# Altium footprint library 排针-排母-1.27.PcbLib: 152 footprints (part 5 of 10)
Each footprint in its own frame and in the unit in brackets; x right, y up, seen from the top. Pads: shape width x height; smd on the part's side, far side on the other; paste and mask are expansions set on the pad; w line width, h text height; cw(c..) or ccw(c..) is an arc to the next point about the centre after c.
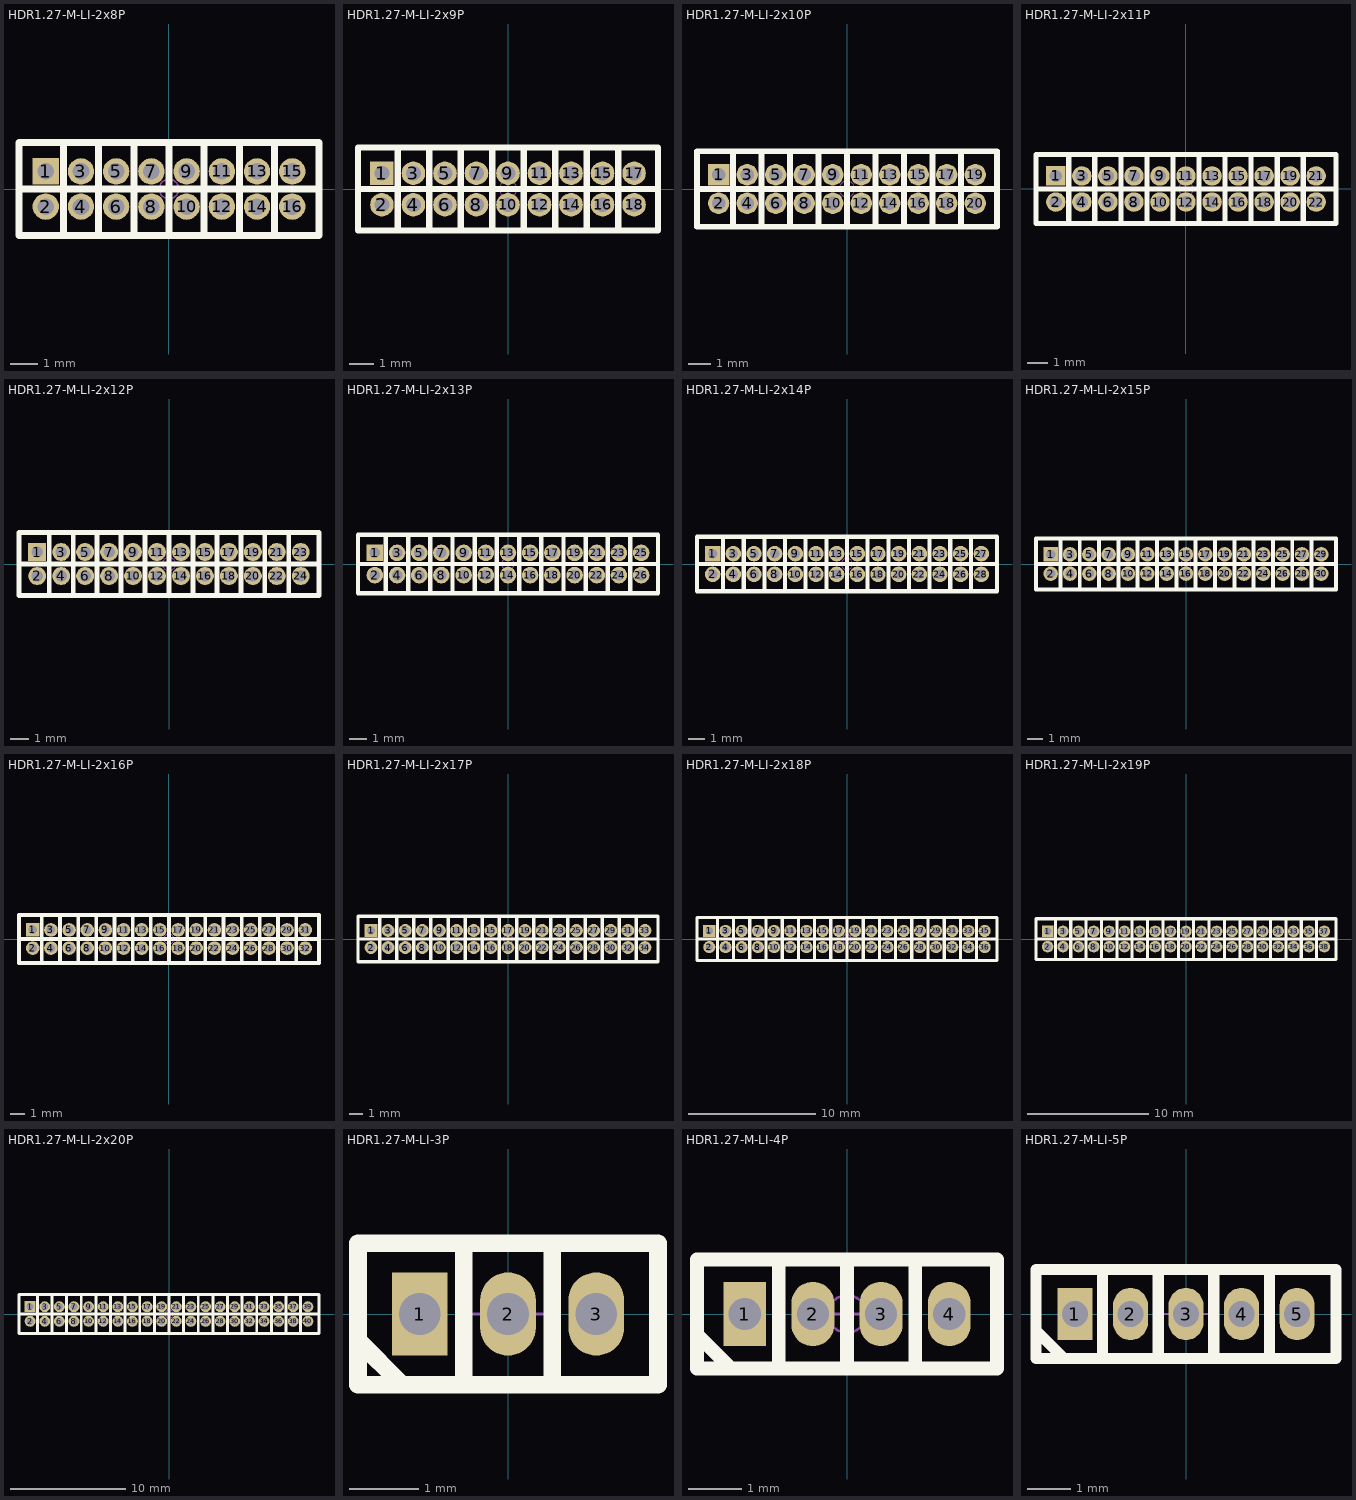
[diagram p4: the footprints below, top view; thin cyan lines are the x and y axes]

## HDR1.27-M-LI-2x8P [mm] "双排直插排母，脚距：1.27mm"
pads (16):
  rect 0.95x0.95 hole 0.6: 1(-4.445,0.635)
  round 0.95 hole 0.6: 2(-4.445,-0.635) 3(-3.175,0.635) 4(-3.175,-0.635) 5(-1.905,0.635) 6(-1.905,-0.635) 7(-0.635,0.635) 8(-0.635,-0.635) 9(0.635,0.635) 10(0.635,-0.635) 11(1.905,0.635) 12(1.905,-0.635) 13(3.175,0.635) 14(3.175,-0.635) 15(4.445,0.635) 16(4.445,-0.635)
Top Overlay:
  lines w0.254: -5.41,0 5.41,0 ; -3.81,-1.65 -3.81,1.65 ; -2.54,-1.65 -2.54,1.65 ; -1.27,-1.65 -1.27,1.65 ; 0,-1.65 0,1.65 ; 1.27,-1.65 1.27,1.65 ; 2.54,-1.65 2.54,1.65 ; 3.81,-1.65 3.81,1.65 ; -5.41,-1.676 5.41,-1.676 5.41,1.676 -5.41,1.676 -5.41,-1.676
Mechanical 15:
  circle w0.05: c0,0 r0.35
  lines w0.05: -0.5,0 0.5,0 ; 0,-0.5 0,0.5
3D body: height 4.45, standoff -2.17, extent 2.54,-1.55 3.81,1.55
3D body: height 4.45, standoff -2.17, extent 1.27,-1.55 2.54,1.55
3D body: height 4.45, standoff -2.17, extent 0,-1.55 1.27,1.55
3D body: height 4.45, standoff -2.17, extent -1.27,-1.55 0,1.55
3D body: height 4.45, standoff -2.17, extent -2.54,-1.55 -1.27,1.55
3D body: height 4.45, standoff -2.17, extent -3.81,-1.55 -2.54,1.55
3D body: height 4.45, standoff -2.17, extent -5.28,-1.55 -3.81,1.55
3D body: height 4.45, standoff -2.17, extent 3.81,-1.55 5.28,1.55

## HDR1.27-M-LI-2x9P [mm] "双排直插排母，脚距：1.27mm"
pads (18):
  rect 0.95x0.95 hole 0.6: 1(-5.08,0.635)
  round 0.95 hole 0.6: 2(-5.08,-0.635) 3(-3.81,0.635) 4(-3.81,-0.635) 5(-2.54,0.635) 6(-2.54,-0.635) 7(-1.27,0.635) 8(-1.27,-0.635) 9(0,0.635) 10(0,-0.635) 11(1.27,0.635) 12(1.27,-0.635) 13(2.54,0.635) 14(2.54,-0.635) 15(3.81,0.635) 16(3.81,-0.635) 17(5.08,0.635) 18(5.08,-0.635)
Top Overlay:
  lines w0.254: -6.045,0 6.045,0 ; -4.445,-1.65 -4.445,1.65 ; -3.175,-1.65 -3.175,1.65 ; -1.905,-1.65 -1.905,1.65 ; -0.635,-1.65 -0.635,1.65 ; 0.635,-1.65 0.635,1.65 ; 1.905,-1.65 1.905,1.65 ; 3.175,-1.65 3.175,1.65 ; 4.445,-1.65 4.445,1.65 ; -6.045,-1.676 -6.045,1.676 6.045,1.676 6.045,-1.676 -6.045,-1.676
Mechanical 15:
  circle w0.05: c0,0 r0.35
  lines w0.05: -0.5,0 0.5,0 ; 0,-0.5 0,0.5
3D body: height 4.45, standoff -2.17, extent -5.915,-1.55 -4.445,1.55
3D body: height 4.45, standoff -2.17, extent -4.445,-1.55 -3.175,1.55
3D body: height 4.45, standoff -2.17, extent -3.175,-1.55 -1.905,1.55
3D body: height 4.45, standoff -2.17, extent -1.905,-1.55 -0.635,1.55
3D body: height 4.45, standoff -2.17, extent -0.635,-1.55 0.635,1.55
3D body: height 4.45, standoff -2.17, extent 0.635,-1.55 1.905,1.55
3D body: height 4.45, standoff -2.17, extent 1.905,-1.55 3.175,1.55
3D body: height 4.45, standoff -2.17, extent 3.175,-1.55 4.445,1.55
3D body: height 4.45, standoff -2.17, extent 4.445,-1.55 5.915,1.55

## HDR1.27-M-LI-2x10P [mm] "双排直插排母，脚距：1.27mm"
pads (20):
  rect 0.95x0.95 hole 0.6: 1(-5.715,0.635)
  round 0.95 hole 0.6: 2(-5.715,-0.635) 3(-4.445,0.635) 4(-4.445,-0.635) 5(-3.175,0.635) 6(-3.175,-0.635) 7(-1.905,0.635) 8(-1.905,-0.635) 9(-0.635,0.635) 10(-0.635,-0.635) 11(0.635,0.635) 12(0.635,-0.635) 13(1.905,0.635) 14(1.905,-0.635) 15(3.175,0.635) 16(3.175,-0.635) 17(4.445,0.635) 18(4.445,-0.635) 19(5.715,0.635) 20(5.715,-0.635)
Top Overlay:
  lines w0.254: -6.68,0 6.68,0 ; -5.08,-1.65 -5.08,1.65 ; -3.81,-1.65 -3.81,1.65 ; -2.54,-1.65 -2.54,1.65 ; -1.27,-1.65 -1.27,1.65 ; 0,-1.65 0,1.65 ; 1.27,-1.65 1.27,1.65 ; 2.54,-1.65 2.54,1.65 ; 3.81,-1.65 3.81,1.65 ; 5.08,-1.65 5.08,1.65 ; -6.68,-1.676 -6.68,1.676 6.68,1.676 6.68,-1.676 -6.68,-1.676
Mechanical 15:
  circle w0.05: c0,0 r0.35
  lines w0.05: -0.5,0 0.5,0 ; 0,-0.5 0,0.5
3D body: height 4.45, standoff -2.17, extent -6.55,-1.55 -5.08,1.55
3D body: height 4.45, standoff -2.17, extent -5.08,-1.55 -3.81,1.55
3D body: height 4.45, standoff -2.17, extent -3.81,-1.55 -2.54,1.55
3D body: height 4.45, standoff -2.17, extent -2.54,-1.55 -1.27,1.55
3D body: height 4.45, standoff -2.17, extent -1.27,-1.55 0,1.55
3D body: height 4.45, standoff -2.17, extent 0,-1.55 1.27,1.55
3D body: height 4.45, standoff -2.17, extent 1.27,-1.55 2.54,1.55
3D body: height 4.45, standoff -2.17, extent 2.54,-1.55 3.81,1.55
3D body: height 4.45, standoff -2.17, extent 3.81,-1.55 5.08,1.55
3D body: height 4.45, standoff -2.17, extent 5.08,-1.55 6.55,1.55

## HDR1.27-M-LI-2x11P [mm] "双排直插排母，脚距：1.27mm"
pads (22):
  rect 0.95x0.95 hole 0.6: 1(-6.35,0.635)
  round 0.95 hole 0.6: 2(-6.35,-0.635) 3(-5.08,0.635) 4(-5.08,-0.635) 5(-3.81,0.635) 6(-3.81,-0.635) 7(-2.54,0.635) 8(-2.54,-0.635) 9(-1.27,0.635) 10(-1.27,-0.635) 11(0,0.635) 12(0,-0.635) 13(1.27,0.635) 14(1.27,-0.635) 15(2.54,0.635) 16(2.54,-0.635) 17(3.81,0.635) 18(3.81,-0.635) 19(5.08,0.635) 20(5.08,-0.635) 21(6.35,0.635) 22(6.35,-0.635)
Top Overlay:
  lines w0.254: -7.315,0 7.315,0 ; -5.715,-1.65 -5.715,1.65 ; -4.445,-1.65 -4.445,1.65 ; -3.175,-1.65 -3.175,1.65 ; -1.905,-1.65 -1.905,1.65 ; -0.635,-1.65 -0.635,1.65 ; 0.635,-1.65 0.635,1.65 ; 1.905,-1.65 1.905,1.65 ; 3.175,-1.65 3.175,1.65 ; 4.445,-1.65 4.445,1.65 ; 5.715,-1.65 5.715,1.65 ; -7.315,-1.676 7.315,-1.676 7.315,1.676 -7.315,1.676 -7.315,-1.676
Mechanical 15:
  circle w0.05: c0,0 r0.35
  lines w0.05: -0.5,0 0.5,0 ; 0,-0.5 0,0.5
3D body: height 4.45, standoff -2.17, extent 4.445,-1.55 5.715,1.55
3D body: height 4.45, standoff -2.17, extent 3.175,-1.55 4.445,1.55
3D body: height 4.45, standoff -2.17, extent 1.905,-1.55 3.175,1.55
3D body: height 4.45, standoff -2.17, extent 0.635,-1.55 1.905,1.55
3D body: height 4.45, standoff -2.17, extent -0.635,-1.55 0.635,1.55
3D body: height 4.45, standoff -2.17, extent -1.905,-1.55 -0.635,1.55
3D body: height 4.45, standoff -2.17, extent -3.175,-1.55 -1.905,1.55
3D body: height 4.45, standoff -2.17, extent -4.445,-1.55 -3.175,1.55
3D body: height 4.45, standoff -2.17, extent -5.715,-1.55 -4.445,1.55
3D body: height 4.45, standoff -2.17, extent -7.185,-1.55 -5.715,1.55
3D body: height 4.45, standoff -2.17, extent 5.715,-1.55 7.185,1.55

## HDR1.27-M-LI-2x12P [mm] "双排直插排母，脚距：1.27mm"
pads (24):
  rect 0.95x0.95 hole 0.6: 1(-6.985,0.635)
  round 0.95 hole 0.6: 2(-6.985,-0.635) 3(-5.715,0.635) 4(-5.715,-0.635) 5(-4.445,0.635) 6(-4.445,-0.635) 7(-3.175,0.635) 8(-3.175,-0.635) 9(-1.905,0.635) 10(-1.905,-0.635) 11(-0.635,0.635) 12(-0.635,-0.635) 13(0.635,0.635) 14(0.635,-0.635) 15(1.905,0.635) 16(1.905,-0.635) 17(3.175,0.635) 18(3.175,-0.635) 19(4.445,0.635) 20(4.445,-0.635) 21(5.715,0.635) 22(5.715,-0.635) 23(6.985,0.635) 24(6.985,-0.635)
Top Overlay:
  lines w0.254: -7.95,0 7.82,0 ; -6.35,-1.65 -6.35,1.65 ; -5.08,-1.65 -5.08,1.65 ; -3.81,-1.65 -3.81,1.65 ; -2.54,-1.65 -2.54,1.65 ; -1.27,-1.65 -1.27,1.65 ; 0,-1.65 0,1.65 ; 1.27,-1.65 1.27,1.65 ; 2.54,-1.65 2.54,1.65 ; 3.81,-1.65 3.81,1.65 ; 5.08,-1.65 5.08,1.65 ; 6.35,-1.65 6.35,1.65 ; -7.95,-1.676 7.95,-1.676 7.95,1.676 -7.95,1.676 -7.95,-1.676
Mechanical 15:
  circle w0.05: c0,0 r0.35
  lines w0.05: -0.5,0 0.5,0 ; 0,-0.5 0,0.5
3D body: height 4.45, standoff -2.17, extent 5.08,-1.55 6.35,1.55
3D body: height 4.45, standoff -2.17, extent 3.81,-1.55 5.08,1.55
3D body: height 4.45, standoff -2.17, extent 2.54,-1.55 3.81,1.55
3D body: height 4.45, standoff -2.17, extent 1.27,-1.55 2.54,1.55
3D body: height 4.45, standoff -2.17, extent 0,-1.55 1.27,1.55
3D body: height 4.45, standoff -2.17, extent -1.27,-1.55 0,1.55
3D body: height 4.45, standoff -2.17, extent -2.54,-1.55 -1.27,1.55
3D body: height 4.45, standoff -2.17, extent -3.81,-1.55 -2.54,1.55
3D body: height 4.45, standoff -2.17, extent -5.08,-1.55 -3.81,1.55
3D body: height 4.45, standoff -2.17, extent -6.35,-1.55 -5.08,1.55
3D body: height 4.45, standoff -2.17, extent -7.82,-1.55 -6.35,1.55
3D body: height 4.45, standoff -2.17, extent 6.35,-1.55 7.82,1.55

## HDR1.27-M-LI-2x13P [mm] "双排直插排母，脚距：1.27mm"
pads (26):
  rect 0.95x0.95 hole 0.6: 1(-7.62,0.635)
  round 0.95 hole 0.6: 2(-7.62,-0.635) 3(-6.35,0.635) 4(-6.35,-0.635) 5(-5.08,0.635) 6(-5.08,-0.635) 7(-3.81,0.635) 8(-3.81,-0.635) 9(-2.54,0.635) 10(-2.54,-0.635) 11(-1.27,0.635) 12(-1.27,-0.635) 13(0,0.635) 14(0,-0.635) 15(1.27,0.635) 16(1.27,-0.635) 17(2.54,0.635) 18(2.54,-0.635) 19(3.81,0.635) 20(3.81,-0.635) 21(5.08,0.635) 22(5.08,-0.635) 23(6.35,0.635) 24(6.35,-0.635) 25(7.62,0.635) 26(7.62,-0.635)
Top Overlay:
  lines w0.254: -8.585,0 8.585,0 ; -6.985,-1.65 -6.985,1.65 ; -5.715,-1.65 -5.715,1.65 ; -4.445,-1.65 -4.445,1.65 ; -3.175,-1.65 -3.175,1.65 ; -1.905,-1.65 -1.905,1.65 ; -0.635,-1.65 -0.635,1.65 ; 0.635,-1.65 0.635,1.65 ; 1.905,-1.65 1.905,1.65 ; 3.175,-1.65 3.175,1.65 ; 4.445,-1.65 4.445,1.65 ; 5.715,-1.65 5.715,1.65 ; 6.985,-1.65 6.985,1.65 ; -8.585,-1.676 -8.585,1.676 8.585,1.676 8.585,-1.676 -8.585,-1.676
Mechanical 15:
  circle w0.05: c0,0 r0.35
  lines w0.05: -0.5,0 0.5,0 ; 0,-0.5 0,0.5
3D body: height 4.45, standoff -2.17, extent -8.455,-1.55 -6.985,1.55
3D body: height 4.45, standoff -2.17, extent -6.985,-1.55 -5.715,1.55
3D body: height 4.45, standoff -2.17, extent -5.715,-1.55 -4.445,1.55
3D body: height 4.45, standoff -2.17, extent -4.445,-1.55 -3.175,1.55
3D body: height 4.45, standoff -2.17, extent -3.175,-1.55 -1.905,1.55
3D body: height 4.45, standoff -2.17, extent -1.905,-1.55 -0.635,1.55
3D body: height 4.45, standoff -2.17, extent -0.635,-1.55 0.635,1.55
3D body: height 4.45, standoff -2.17, extent 0.635,-1.55 1.905,1.55
3D body: height 4.45, standoff -2.17, extent 1.905,-1.55 3.175,1.55
3D body: height 4.45, standoff -2.17, extent 3.175,-1.55 4.445,1.55
3D body: height 4.45, standoff -2.17, extent 4.445,-1.55 5.715,1.55
3D body: height 4.45, standoff -2.17, extent 5.715,-1.55 6.985,1.55
3D body: height 4.45, standoff -2.17, extent 6.985,-1.55 8.455,1.55

## HDR1.27-M-LI-2x14P [mm] "双排直插排母，脚距：1.27mm"
pads (28):
  rect 0.95x0.95 hole 0.6: 1(-8.255,0.635)
  round 0.95 hole 0.6: 2(-8.255,-0.635) 3(-6.985,0.635) 4(-6.985,-0.635) 5(-5.715,0.635) 6(-5.715,-0.635) 7(-4.445,0.635) 8(-4.445,-0.635) 9(-3.175,0.635) 10(-3.175,-0.635) 11(-1.905,0.635) 12(-1.905,-0.635) 13(-0.635,0.635) 14(-0.635,-0.635) 15(0.635,0.635) 16(0.635,-0.635) 17(1.905,0.635) 18(1.905,-0.635) 19(3.175,0.635) 20(3.175,-0.635) 21(4.445,0.635) 22(4.445,-0.635) 23(5.715,0.635) 24(5.715,-0.635) 25(6.985,0.635) 26(6.985,-0.635) 27(8.255,0.635) 28(8.255,-0.635)
Top Overlay:
  lines w0.254: -9.22,0 9.22,0 ; -7.62,-1.65 -7.62,1.65 ; -6.35,-1.65 -6.35,1.65 ; -5.08,-1.65 -5.08,1.65 ; -3.81,-1.65 -3.81,1.65 ; -2.54,-1.65 -2.54,1.65 ; -1.27,-1.65 -1.27,1.65 ; 0,-1.65 0,1.65 ; 1.27,-1.65 1.27,1.65 ; 2.54,-1.65 2.54,1.65 ; 3.81,-1.65 3.81,1.65 ; 5.08,-1.65 5.08,1.65 ; 6.35,-1.65 6.35,1.65 ; 7.62,-1.65 7.62,1.65 ; -9.22,-1.676 -9.22,1.676 9.22,1.676 9.22,-1.676 -9.22,-1.676
Mechanical 15:
  circle w0.05: c0,0 r0.35
  lines w0.05: -0.5,0 0.5,0 ; 0,-0.5 0,0.5
3D body: height 4.45, standoff -2.17, extent -9.09,-1.55 -7.62,1.55
3D body: height 4.45, standoff -2.17, extent -7.62,-1.55 -6.35,1.55
3D body: height 4.45, standoff -2.17, extent -6.35,-1.55 -5.08,1.55
3D body: height 4.45, standoff -2.17, extent -5.08,-1.55 -3.81,1.55
3D body: height 4.45, standoff -2.17, extent -3.81,-1.55 -2.54,1.55
3D body: height 4.45, standoff -2.17, extent -2.54,-1.55 -1.27,1.55
3D body: height 4.45, standoff -2.17, extent -1.27,-1.55 0,1.55
3D body: height 4.45, standoff -2.17, extent 0,-1.55 1.27,1.55
3D body: height 4.45, standoff -2.17, extent 1.27,-1.55 2.54,1.55
3D body: height 4.45, standoff -2.17, extent 2.54,-1.55 3.81,1.55
3D body: height 4.45, standoff -2.17, extent 3.81,-1.55 5.08,1.55
3D body: height 4.45, standoff -2.17, extent 5.08,-1.55 6.35,1.55
3D body: height 4.45, standoff -2.17, extent 6.35,-1.55 7.62,1.55
3D body: height 4.45, standoff -2.17, extent 7.62,-1.55 9.09,1.55

## HDR1.27-M-LI-2x15P [mm] "双排直插排母，脚距：1.27mm"
pads (30):
  rect 0.95x0.95 hole 0.6: 1(-8.89,0.635)
  round 0.95 hole 0.6: 2(-8.89,-0.635) 3(-7.62,0.635) 4(-7.62,-0.635) 5(-6.35,0.635) 6(-6.35,-0.635) 7(-5.08,0.635) 8(-5.08,-0.635) 9(-3.81,0.635) 10(-3.81,-0.635) 11(-2.54,0.635) 12(-2.54,-0.635) 13(-1.27,0.635) 14(-1.27,-0.635) 15(0,0.635) 16(0,-0.635) 17(1.27,0.635) 18(1.27,-0.635) 19(2.54,0.635) 20(2.54,-0.635) 21(3.81,0.635) 22(3.81,-0.635) 23(5.08,0.635) 24(5.08,-0.635) 25(6.35,0.635) 26(6.35,-0.635) 27(7.62,0.635) 28(7.62,-0.635) 29(8.89,0.635) 30(8.89,-0.635)
Top Overlay:
  lines w0.254: -9.855,0 9.855,0 ; -8.255,-1.65 -8.255,1.65 ; -6.985,-1.65 -6.985,1.65 ; -5.715,-1.65 -5.715,1.65 ; -4.445,-1.65 -4.445,1.65 ; -3.175,-1.65 -3.175,1.65 ; -1.905,-1.65 -1.905,1.65 ; -0.635,-1.65 -0.635,1.65 ; 0.635,-1.65 0.635,1.65 ; 1.905,-1.65 1.905,1.65 ; 3.175,-1.65 3.175,1.65 ; 4.445,-1.65 4.445,1.65 ; 5.715,-1.65 5.715,1.65 ; 6.985,-1.65 6.985,1.65 ; 8.255,-1.65 8.255,1.65 ; -9.855,-1.676 9.855,-1.676 9.855,1.676 -9.855,1.676 -9.855,-1.676
Mechanical 15:
  circle w0.05: c0,0 r0.35
  lines w0.05: -0.5,0 0.5,0 ; 0,-0.5 0,0.5
3D body: height 4.45, standoff -2.17, extent 5.715,-1.55 6.985,1.55
3D body: height 4.45, standoff -2.17, extent 6.985,-1.55 8.255,1.55
3D body: height 4.45, standoff -2.17, extent 4.445,-1.55 5.715,1.55
3D body: height 4.45, standoff -2.17, extent 3.175,-1.55 4.445,1.55
3D body: height 4.45, standoff -2.17, extent 1.905,-1.55 3.175,1.55
3D body: height 4.45, standoff -2.17, extent 0.635,-1.55 1.905,1.55
3D body: height 4.45, standoff -2.17, extent -0.635,-1.55 0.635,1.55
3D body: height 4.45, standoff -2.17, extent -1.905,-1.55 -0.635,1.55
3D body: height 4.45, standoff -2.17, extent -3.175,-1.55 -1.905,1.55
3D body: height 4.45, standoff -2.17, extent -4.445,-1.55 -3.175,1.55
3D body: height 4.45, standoff -2.17, extent -5.715,-1.55 -4.445,1.55
3D body: height 4.45, standoff -2.17, extent -6.985,-1.55 -5.715,1.55
3D body: height 4.45, standoff -2.17, extent -8.255,-1.55 -6.985,1.55
3D body: height 4.45, standoff -2.17, extent -9.725,-1.55 -8.255,1.55
3D body: height 4.45, standoff -2.17, extent 8.255,-1.55 9.725,1.55

## HDR1.27-M-LI-2x16P [mm] "双排直插排母，脚距：1.27mm"
pads (32):
  rect 0.95x0.95 hole 0.6: 1(-9.525,0.635)
  round 0.95 hole 0.6: 2(-9.525,-0.635) 3(-8.255,0.635) 4(-8.255,-0.635) 5(-6.985,0.635) 6(-6.985,-0.635) 7(-5.715,0.635) 8(-5.715,-0.635) 9(-4.445,0.635) 10(-4.445,-0.635) 11(-3.175,0.635) 12(-3.175,-0.635) 13(-1.905,0.635) 14(-1.905,-0.635) 15(-0.635,0.635) 16(-0.635,-0.635) 17(0.635,0.635) 18(0.635,-0.635) 19(1.905,0.635) 20(1.905,-0.635) 21(3.175,0.635) 22(3.175,-0.635) 23(4.445,0.635) 24(4.445,-0.635) 25(5.715,0.635) 26(5.715,-0.635) 27(6.985,0.635) 28(6.985,-0.635) 29(8.255,0.635) 30(8.255,-0.635) 31(9.525,0.635) 32(9.525,-0.635)
Top Overlay:
  lines w0.254: -10.49,0 10.49,0 ; -8.89,-1.65 -8.89,1.65 ; -7.62,-1.65 -7.62,1.65 ; -6.35,-1.65 -6.35,1.65 ; -5.08,-1.65 -5.08,1.65 ; -3.81,-1.65 -3.81,1.65 ; -2.54,-1.65 -2.54,1.65 ; -1.27,-1.65 -1.27,1.65 ; 0,-1.65 0,1.65 ; 1.27,-1.65 1.27,1.65 ; 2.54,-1.65 2.54,1.65 ; 3.81,-1.65 3.81,1.65 ; 5.08,-1.65 5.08,1.65 ; 6.35,-1.65 6.35,1.65 ; 7.62,-1.65 7.62,1.65 ; 8.89,-1.65 8.89,1.65 ; -10.49,-1.676 10.49,-1.676 10.49,1.676 -10.49,1.676 -10.49,-1.676
Mechanical 15:
  circle w0.05: c0,0 r0.35
  lines w0.05: -0.5,0 0.5,0 ; 0,-0.5 0,0.5
3D body: height 4.45, standoff -2.17, extent 8.89,-1.55 10.36,1.55
3D body: height 4.45, standoff -2.17, extent 5.08,-1.55 6.35,1.55
3D body: height 4.45, standoff -2.17, extent 6.35,-1.55 7.62,1.55
3D body: height 4.45, standoff -2.17, extent 7.62,-1.55 8.89,1.55
3D body: height 4.45, standoff -2.17, extent 3.81,-1.55 5.08,1.55
3D body: height 4.45, standoff -2.17, extent 2.54,-1.55 3.81,1.55
3D body: height 4.45, standoff -2.17, extent 1.27,-1.55 2.54,1.55
3D body: height 4.45, standoff -2.17, extent 0,-1.55 1.27,1.55
3D body: height 4.45, standoff -2.17, extent -1.27,-1.55 0,1.55
3D body: height 4.45, standoff -2.17, extent -2.54,-1.55 -1.27,1.55
3D body: height 4.45, standoff -2.17, extent -3.81,-1.55 -2.54,1.55
3D body: height 4.45, standoff -2.17, extent -5.08,-1.55 -3.81,1.55
3D body: height 4.45, standoff -2.17, extent -6.35,-1.55 -5.08,1.55
3D body: height 4.45, standoff -2.17, extent -7.62,-1.55 -6.35,1.55
3D body: height 4.45, standoff -2.17, extent -8.89,-1.55 -7.62,1.55
3D body: height 4.45, standoff -2.17, extent -10.36,-1.55 -8.89,1.55

## HDR1.27-M-LI-2x17P [mm] "双排直插排母，脚距：1.27mm"
pads (34):
  rect 0.95x0.95 hole 0.6: 1(-10.16,0.635)
  round 0.95 hole 0.6: 2(-10.16,-0.635) 3(-8.89,0.635) 4(-8.89,-0.635) 5(-7.62,0.635) 6(-7.62,-0.635) 7(-6.35,0.635) 8(-6.35,-0.635) 9(-5.08,0.635) 10(-5.08,-0.635) 11(-3.81,0.635) 12(-3.81,-0.635) 13(-2.54,0.635) 14(-2.54,-0.635) 15(-1.27,0.635) 16(-1.27,-0.635) 17(0,0.635) 18(0,-0.635) 19(1.27,0.635) 20(1.27,-0.635) 21(2.54,0.635) 22(2.54,-0.635) 23(3.81,0.635) 24(3.81,-0.635) 25(5.08,0.635) 26(5.08,-0.635) 27(6.35,0.635) 28(6.35,-0.635) 29(7.62,0.635) 30(7.62,-0.635) 31(8.89,0.635) 32(8.89,-0.635) 33(10.16,0.635) 34(10.16,-0.635)
Top Overlay:
  lines w0.254: -11.125,0 11.125,0 ; -9.525,-1.65 -9.525,1.65 ; -8.255,-1.65 -8.255,1.65 ; -6.985,-1.65 -6.985,1.65 ; -5.715,-1.65 -5.715,1.65 ; -4.445,-1.65 -4.445,1.65 ; -3.175,-1.65 -3.175,1.65 ; -1.905,-1.65 -1.905,1.65 ; -0.635,-1.65 -0.635,1.65 ; 0.635,-1.65 0.635,1.65 ; 1.905,-1.65 1.905,1.65 ; 3.175,-1.65 3.175,1.65 ; 4.445,-1.65 4.445,1.65 ; 5.715,-1.65 5.715,1.65 ; 6.985,-1.65 6.985,1.65 ; 8.255,-1.65 8.255,1.65 ; 9.525,-1.65 9.525,1.65 ; -11.125,-1.676 11.125,-1.676 11.125,1.676 -11.125,1.676 -11.125,-1.676
Mechanical 15:
  circle w0.05: c0,0 r0.35
  lines w0.05: -0.5,0 0.5,0 ; 0,-0.5 0,0.5
3D body: height 4.45, standoff -2.17, extent 4.445,-1.55 5.715,1.55
3D body: height 4.45, standoff -2.17, extent 5.715,-1.55 6.985,1.55
3D body: height 4.45, standoff -2.17, extent 6.985,-1.55 8.255,1.55
3D body: height 4.45, standoff -2.17, extent 8.255,-1.55 9.525,1.55
3D body: height 4.45, standoff -2.17, extent 3.175,-1.55 4.445,1.55
3D body: height 4.45, standoff -2.17, extent 1.905,-1.55 3.175,1.55
3D body: height 4.45, standoff -2.17, extent 0.635,-1.55 1.905,1.55
3D body: height 4.45, standoff -2.17, extent -0.635,-1.55 0.635,1.55
3D body: height 4.45, standoff -2.17, extent -1.905,-1.55 -0.635,1.55
3D body: height 4.45, standoff -2.17, extent -3.175,-1.55 -1.905,1.55
3D body: height 4.45, standoff -2.17, extent -4.445,-1.55 -3.175,1.55
3D body: height 4.45, standoff -2.17, extent -5.715,-1.55 -4.445,1.55
3D body: height 4.45, standoff -2.17, extent -6.985,-1.55 -5.715,1.55
3D body: height 4.45, standoff -2.17, extent -8.255,-1.55 -6.985,1.55
3D body: height 4.45, standoff -2.17, extent -9.525,-1.55 -8.255,1.55
3D body: height 4.45, standoff -2.17, extent -10.995,-1.55 -9.525,1.55
3D body: height 4.45, standoff -2.17, extent 9.525,-1.55 10.995,1.55

## HDR1.27-M-LI-2x18P [mm] "双排直插排母，脚距：1.27mm"
pads (36):
  rect 0.95x0.95 hole 0.6: 1(-10.795,0.635)
  round 0.95 hole 0.6: 2(-10.795,-0.635) 3(-9.525,0.635) 4(-9.525,-0.635) 5(-8.255,0.635) 6(-8.255,-0.635) 7(-6.985,0.635) 8(-6.985,-0.635) 9(-5.715,0.635) 10(-5.715,-0.635) 11(-4.445,0.635) 12(-4.445,-0.635) 13(-3.175,0.635) 14(-3.175,-0.635) 15(-1.905,0.635) 16(-1.905,-0.635) 17(-0.635,0.635) 18(-0.635,-0.635) 19(0.635,0.635) 20(0.635,-0.635) 21(1.905,0.635) 22(1.905,-0.635) 23(3.175,0.635) 24(3.175,-0.635) 25(4.445,0.635) 26(4.445,-0.635) 27(5.715,0.635) 28(5.715,-0.635) 29(6.985,0.635) 30(6.985,-0.635) 31(8.255,0.635) 32(8.255,-0.635) 33(9.525,0.635) 34(9.525,-0.635) 35(10.795,0.635) 36(10.795,-0.635)
Top Overlay:
  lines w0.254: -11.76,0 11.76,0 ; -10.16,-1.65 -10.16,1.65 ; -8.89,-1.65 -8.89,1.65 ; -7.62,-1.65 -7.62,1.65 ; -6.35,-1.65 -6.35,1.65 ; -5.08,-1.65 -5.08,1.65 ; -3.81,-1.65 -3.81,1.65 ; -2.54,-1.65 -2.54,1.65 ; -1.27,-1.65 -1.27,1.65 ; 0,-1.65 0,1.65 ; 1.27,-1.65 1.27,1.65 ; 2.54,-1.65 2.54,1.65 ; 3.81,-1.65 3.81,1.65 ; 5.08,-1.65 5.08,1.65 ; 6.35,-1.65 6.35,1.65 ; 7.62,-1.65 7.62,1.65 ; 8.89,-1.65 8.89,1.65 ; 10.16,-1.65 10.16,1.65 ; -11.76,-1.676 11.76,-1.676 11.76,1.676 -11.76,1.676 -11.76,-1.676
Mechanical 15:
  circle w0.05: c0,0 r0.35
  lines w0.05: -0.5,0 0.5,0 ; 0,-0.5 0,0.5
3D body: height 4.45, standoff -2.17, extent 3.81,-1.55 5.08,1.55
3D body: height 4.45, standoff -2.17, extent 5.08,-1.55 6.35,1.55
3D body: height 4.45, standoff -2.17, extent 6.35,-1.55 7.62,1.55
3D body: height 4.45, standoff -2.17, extent 7.62,-1.55 8.89,1.55
3D body: height 4.45, standoff -2.17, extent 8.89,-1.55 10.16,1.55
3D body: height 4.45, standoff -2.17, extent 2.54,-1.55 3.81,1.55
3D body: height 4.45, standoff -2.17, extent 1.27,-1.55 2.54,1.55
3D body: height 4.45, standoff -2.17, extent 0,-1.55 1.27,1.55
3D body: height 4.45, standoff -2.17, extent -1.27,-1.55 0,1.55
3D body: height 4.45, standoff -2.17, extent -2.54,-1.55 -1.27,1.55
3D body: height 4.45, standoff -2.17, extent -3.81,-1.55 -2.54,1.55
3D body: height 4.45, standoff -2.17, extent -5.08,-1.55 -3.81,1.55
3D body: height 4.45, standoff -2.17, extent -6.35,-1.55 -5.08,1.55
3D body: height 4.45, standoff -2.17, extent -7.62,-1.55 -6.35,1.55
3D body: height 4.45, standoff -2.17, extent -8.89,-1.55 -7.62,1.55
3D body: height 4.45, standoff -2.17, extent -10.16,-1.55 -8.89,1.55
3D body: height 4.45, standoff -2.17, extent -11.63,-1.55 -10.16,1.55
3D body: height 4.45, standoff -2.17, extent 10.16,-1.55 11.63,1.55

## HDR1.27-M-LI-2x19P [mm] "双排直插排母，脚距：1.27mm"
pads (38):
  rect 0.95x0.95 hole 0.6: 1(-11.43,0.635)
  round 0.95 hole 0.6: 2(-11.43,-0.635) 3(-10.16,0.635) 4(-10.16,-0.635) 5(-8.89,0.635) 6(-8.89,-0.635) 7(-7.62,0.635) 8(-7.62,-0.635) 9(-6.35,0.635) 10(-6.35,-0.635) 11(-5.08,0.635) 12(-5.08,-0.635) 13(-3.81,0.635) 14(-3.81,-0.635) 15(-2.54,0.635) 16(-2.54,-0.635) 17(-1.27,0.635) 18(-1.27,-0.635) 19(0,0.635) 20(0,-0.635) 21(1.27,0.635) 22(1.27,-0.635) 23(2.54,0.635) 24(2.54,-0.635) 25(3.81,0.635) 26(3.81,-0.635) 27(5.08,0.635) 28(5.08,-0.635) 29(6.35,0.635) 30(6.35,-0.635) 31(7.62,0.635) 32(7.62,-0.635) 33(8.89,0.635) 34(8.89,-0.635) 35(10.16,0.635) 36(10.16,-0.635) 37(11.43,0.635) 38(11.43,-0.635)
Top Overlay:
  lines w0.254: -12.395,0 12.395,0 ; -10.795,-1.65 -10.795,1.65 ; -9.525,-1.65 -9.525,1.65 ; -8.255,-1.65 -8.255,1.65 ; -6.985,-1.65 -6.985,1.65 ; -5.715,-1.65 -5.715,1.65 ; -4.445,-1.65 -4.445,1.65 ; -3.175,-1.65 -3.175,1.65 ; -1.905,-1.65 -1.905,1.65 ; -0.635,-1.65 -0.635,1.65 ; 0.635,-1.65 0.635,1.65 ; 1.905,-1.65 1.905,1.65 ; 3.175,-1.65 3.175,1.65 ; 4.445,-1.65 4.445,1.65 ; 5.715,-1.65 5.715,1.65 ; 6.985,-1.65 6.985,1.65 ; 8.255,-1.65 8.255,1.65 ; 9.525,-1.65 9.525,1.65 ; 10.795,-1.65 10.795,1.65 ; -12.395,-1.676 -12.395,1.676 12.395,1.676 12.395,-1.676 -12.395,-1.676
Mechanical 15:
  circle w0.05: c0,0 r0.35
  lines w0.05: -0.5,0 0.5,0 ; 0,-0.5 0,0.5
3D body: height 4.45, standoff -2.17, extent -12.265,-1.55 -10.795,1.55
3D body: height 4.45, standoff -2.17, extent -10.795,-1.55 -9.525,1.55
3D body: height 4.45, standoff -2.17, extent -9.525,-1.55 -8.255,1.55
3D body: height 4.45, standoff -2.17, extent -8.255,-1.55 -6.985,1.55
3D body: height 4.45, standoff -2.17, extent -6.985,-1.55 -5.715,1.55
3D body: height 4.45, standoff -2.17, extent -5.715,-1.55 -4.445,1.55
3D body: height 4.45, standoff -2.17, extent -4.445,-1.55 -3.175,1.55
3D body: height 4.45, standoff -2.17, extent -3.175,-1.55 -1.905,1.55
3D body: height 4.45, standoff -2.17, extent -1.905,-1.55 -0.635,1.55
3D body: height 4.45, standoff -2.17, extent -0.635,-1.55 0.635,1.55
3D body: height 4.45, standoff -2.17, extent 0.635,-1.55 1.905,1.55
3D body: height 4.45, standoff -2.17, extent 1.905,-1.55 3.175,1.55
3D body: height 4.45, standoff -2.17, extent 9.525,-1.55 10.795,1.55
3D body: height 4.45, standoff -2.17, extent 8.255,-1.55 9.525,1.55
3D body: height 4.45, standoff -2.17, extent 6.985,-1.55 8.255,1.55
3D body: height 4.45, standoff -2.17, extent 5.715,-1.55 6.985,1.55
3D body: height 4.45, standoff -2.17, extent 4.445,-1.55 5.715,1.55
3D body: height 4.45, standoff -2.17, extent 3.175,-1.55 4.445,1.55
3D body: height 4.45, standoff -2.17, extent 10.795,-1.55 12.265,1.55

## HDR1.27-M-LI-2x20P [mm] "双排直插排母，脚距：1.27mm"
pads (40):
  rect 0.95x0.95 hole 0.6: 1(-12.065,0.635)
  round 0.95 hole 0.6: 2(-12.065,-0.635) 3(-10.795,0.635) 4(-10.795,-0.635) 5(-9.525,0.635) 6(-9.525,-0.635) 7(-8.255,0.635) 8(-8.255,-0.635) 9(-6.985,0.635) 10(-6.985,-0.635) 11(-5.715,0.635) 12(-5.715,-0.635) 13(-4.445,0.635) 14(-4.445,-0.635) 15(-3.175,0.635) 16(-3.175,-0.635) 17(-1.905,0.635) 18(-1.905,-0.635) 19(-0.635,0.635) 20(-0.635,-0.635) 21(0.635,0.635) 22(0.635,-0.635) 23(1.905,0.635) 24(1.905,-0.635) 25(3.175,0.635) 26(3.175,-0.635) 27(4.445,0.635) 28(4.445,-0.635) 29(5.715,0.635) 30(5.715,-0.635) 31(6.985,0.635) 32(6.985,-0.635) 33(8.255,0.635) 34(8.255,-0.635) 35(9.525,0.635) 36(9.525,-0.635) 37(10.795,0.635) 38(10.795,-0.635) 39(12.065,0.635) 40(12.065,-0.635)
Top Overlay:
  lines w0.254: -13.03,0 13.03,0 ; -11.43,-1.65 -11.43,1.65 ; -10.16,-1.65 -10.16,1.65 ; -8.89,-1.65 -8.89,1.65 ; -7.62,-1.65 -7.62,1.65 ; -6.35,-1.65 -6.35,1.65 ; -5.08,-1.65 -5.08,1.65 ; -3.81,-1.65 -3.81,1.65 ; -2.54,-1.65 -2.54,1.65 ; -1.27,-1.65 -1.27,1.65 ; 0,-1.65 0,1.65 ; 1.27,-1.65 1.27,1.65 ; 2.54,-1.65 2.54,1.65 ; 3.81,-1.65 3.81,1.65 ; 5.08,-1.65 5.08,1.65 ; 6.35,-1.65 6.35,1.65 ; 7.62,-1.65 7.62,1.65 ; 8.89,-1.65 8.89,1.65 ; 10.16,-1.65 10.16,1.65 ; 11.43,-1.65 11.43,1.65 ; -13.03,-1.676 -13.03,1.676 13.03,1.676 13.03,-1.676 -13.03,-1.676
Mechanical 15:
  circle w0.05: c0,0 r0.35
  lines w0.05: -0.5,0 0.5,0 ; 0,-0.5 0,0.5
3D body: height 4.45, standoff -2.17, extent -12.9,-1.55 -11.43,1.55
3D body: height 4.45, standoff -2.17, extent -11.43,-1.55 -10.16,1.55
3D body: height 4.45, standoff -2.17, extent 10.16,-1.55 11.43,1.55
3D body: height 4.45, standoff -2.17, extent -10.16,-1.55 -8.89,1.55
3D body: height 4.45, standoff -2.17, extent -8.89,-1.55 -7.62,1.55
3D body: height 4.45, standoff -2.17, extent -7.62,-1.55 -6.35,1.55
3D body: height 4.45, standoff -2.17, extent -6.35,-1.55 -5.08,1.55
3D body: height 4.45, standoff -2.17, extent -5.08,-1.55 -3.81,1.55
3D body: height 4.45, standoff -2.17, extent -3.81,-1.55 -2.54,1.55
3D body: height 4.45, standoff -2.17, extent -2.54,-1.55 -1.27,1.55
3D body: height 4.45, standoff -2.17, extent -1.27,-1.55 0,1.55
3D body: height 4.45, standoff -2.17, extent 0,-1.55 1.27,1.55
3D body: height 4.45, standoff -2.17, extent 1.27,-1.55 2.54,1.55
3D body: height 4.45, standoff -2.17, extent 8.89,-1.55 10.16,1.55
3D body: height 4.45, standoff -2.17, extent 7.62,-1.55 8.89,1.55
3D body: height 4.45, standoff -2.17, extent 6.35,-1.55 7.62,1.55
3D body: height 4.45, standoff -2.17, extent 5.08,-1.55 6.35,1.55
3D body: height 4.45, standoff -2.17, extent 3.81,-1.55 5.08,1.55
3D body: height 4.45, standoff -2.17, extent 2.54,-1.55 3.81,1.55
3D body: height 4.45, standoff -2.17, extent 11.43,-1.55 12.9,1.55

## HDR1.27-M-LI-3P [mm] "直插，脚距：1.27mm"
pads (3):
  rect 0.8x1.2 hole 0.6: 1(-1.27,0)
  oval 0.8x1.2 hole 0.6: 2(0,0) 3(1.27,0)
Top Overlay:
  lines w0.254: -2.159,-0.254 -2.159,-0.381 -1.524,-1.016 ; -0.635,-1.016 -0.635,1.016 ; 0.635,-1.016 0.635,1.016 ; -2.159,-1.016 -2.159,1.016 2.159,1.016 2.159,-1.016 -2.159,-1.016
Mechanical 15:
  circle w0.05: c0,0 r0.35
  lines w0.05: -0.5,0 0.5,0 ; 0,-0.5 0,0.5
3D body: height 4.5, standoff -2.1, extent -2.07,-0.9 2.07,0.9

## HDR1.27-M-LI-4P [mm] "直插，脚距：1.27mm"
pads (4):
  rect 0.8x1.2 hole 0.6: 1(-1.905,0)
  oval 0.8x1.2 hole 0.6: 2(-0.635,0) 3(0.635,0) 4(1.905,0)
Top Overlay:
  lines w0.254: -2.794,-0.254 -2.794,-0.381 -2.159,-1.016 ; -1.27,-1.016 -1.27,1.016 ; 0,-1.016 0,1.016 ; 1.27,-1.016 1.27,1.016 ; -2.794,-1.016 2.794,-1.016 2.794,1.016 -2.794,1.016 -2.794,-1.016
Mechanical 15:
  circle w0.05: c0,0 r0.35
  lines w0.05: -0.5,0 0.5,0 ; 0,-0.5 0,0.5
3D body: height 4.5, standoff -2.1, extent -2.705,-0.9 2.705,0.9

## HDR1.27-M-LI-5P [mm] "直插，脚距：1.27mm"
pads (5):
  rect 0.8x1.2 hole 0.6: 1(-2.54,0)
  oval 0.8x1.2 hole 0.6: 2(-1.27,0) 3(0,0) 4(1.27,0) 5(2.54,0)
Top Overlay:
  lines w0.254: -3.429,-0.254 -3.429,-0.381 -2.794,-1.016 ; -1.905,-1.016 -1.905,1.016 ; -0.635,-1.016 -0.635,1.016 ; 0.635,-1.016 0.635,1.016 ; 1.905,-1.016 1.905,1.016 ; -3.429,-1.016 3.429,-1.016 3.429,1.016 -3.429,1.016 -3.429,-1.016
Mechanical 15:
  circle w0.05: c0,0 r0.35
  lines w0.05: -0.5,0 0.5,0 ; 0,-0.5 0,0.5
3D body: height 4.5, standoff -2.1, extent -3.34,-0.9 3.34,0.9